# Altium footprint library Item_pcb.PcbLib: 282 footprints (part 17 of 18)
Each footprint in its own frame and in the unit in brackets; x right, y up, seen from the top. Pads: shape width x height; smd on the part's side, far side on the other; paste and mask are expansions set on the pad; w line width, h text height; cw(c..) or ccw(c..) is an arc to the next point about the centre after c.
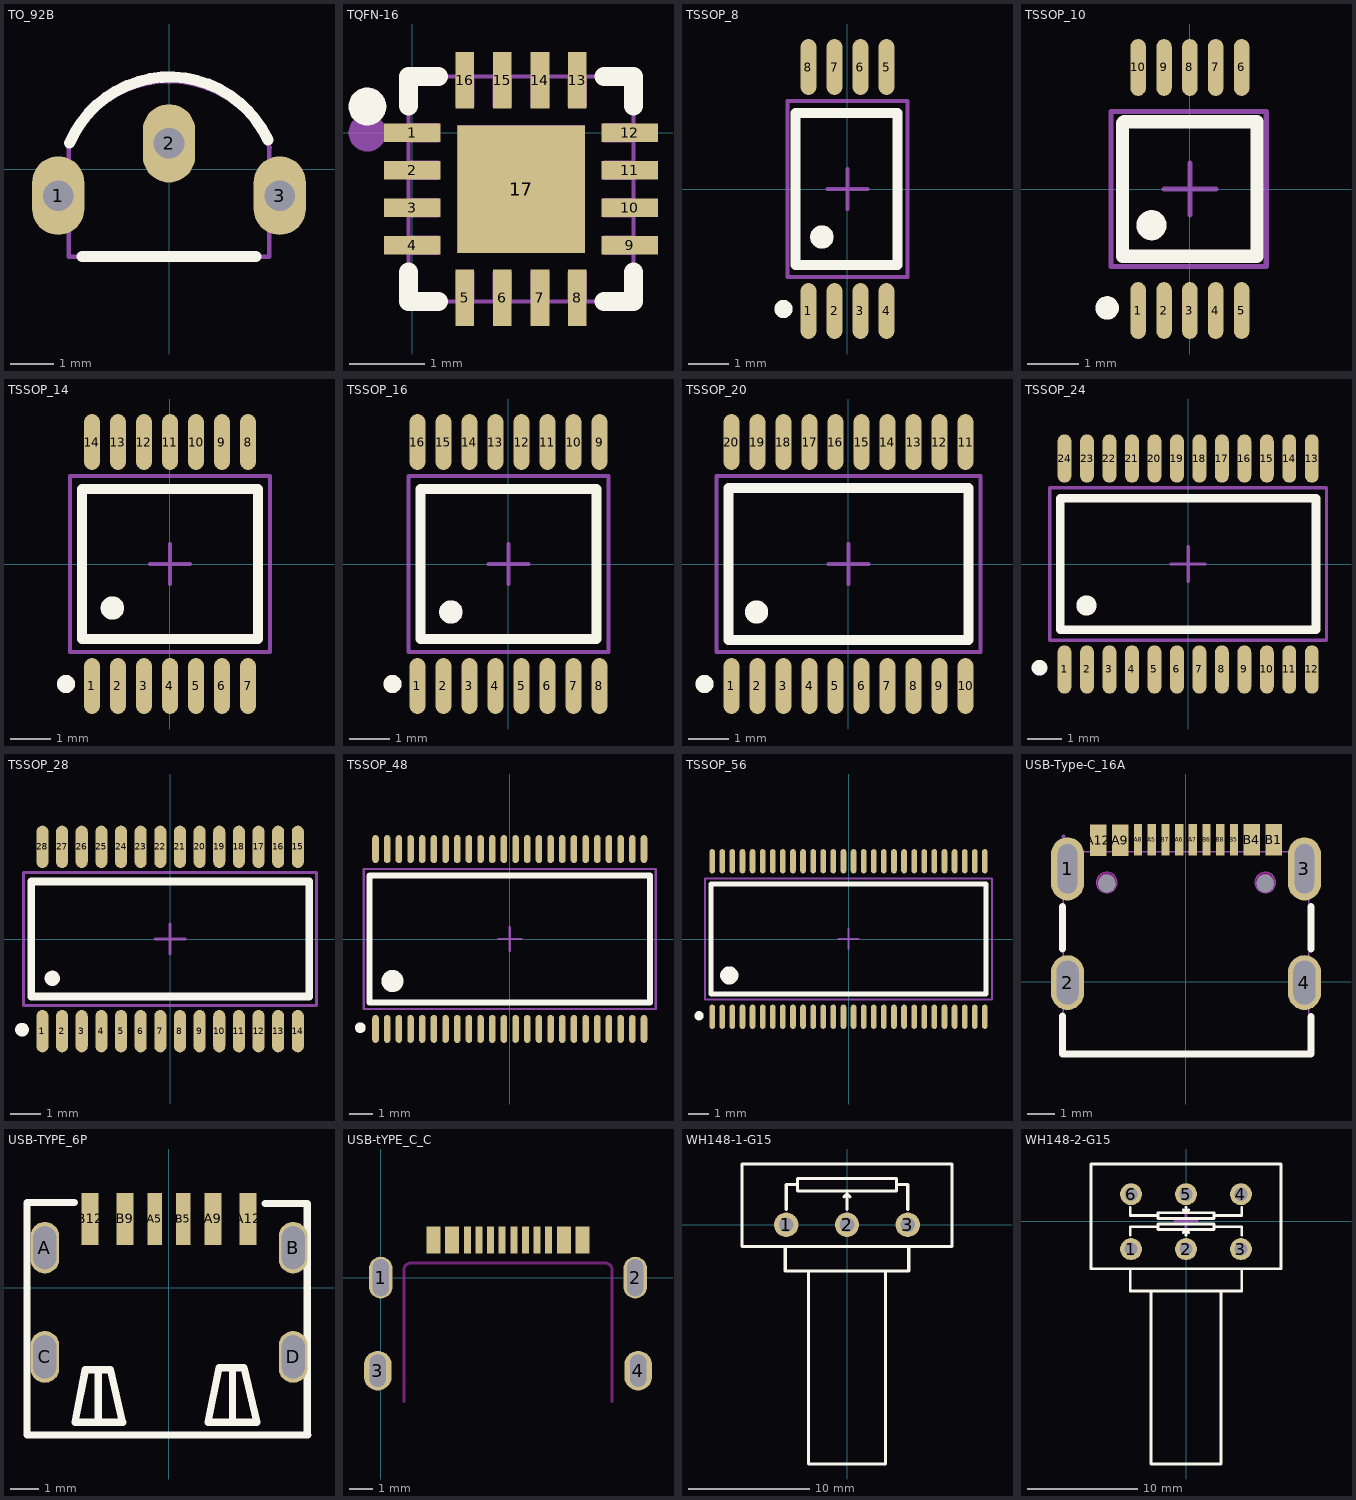
[diagram p16: the footprints below, top view; thin cyan lines are the x and y axes]

## TO_92B [mm]
pads (3):
  oval 1.2x1.8 hole 0.7: 1(-2.54,-0.6) 2(0,0.6) 3(2.54,-0.6)
Top Overlay:
  lines w0.254: -2.277,0.603 cw(c0.011,-0.363) 2.267,0.677 ; -2,-2 2,-2
Mechanical 15:
  lines w0.1: -2.309,0.504 cw(c0,-0.5) 2.309,0.504 ; -2.3,0.5 -2.3,-2 2.3,-2 2.3,0.5
3D body "TO-92B.STEP": height 7.34, standoff -0.7, extent -2.8,-2 2.88,1.8

## TQFN-16 [mm]
pads (17):
  rect 0.75x0.25 smd paste-100 mask+0.051: 1(0,0) 2(0,-0.5) 3(0,-1) 4(0,-1.5) 9(2.9,-1.498) 10(2.9,-0.998) 11(2.9,-0.498) 12(2.9,0.001)
  rect 0.25x0.75 smd paste-100 mask+0.051: 5(0.7,-2.198) 6(1.2,-2.198) 7(1.7,-2.198) 8(2.2,-2.198) 13(2.2,0.702) 14(1.7,0.702) 15(1.2,0.702) 16(0.7,0.702)
  rect 1.7x1.7 smd paste-100 mask+0.051: 17(1.45,-0.749)
Top Overlay:
  circle w0.254: c-0.6,0.352 r0.125
  lines w0.254: -0.05,-1.856 -0.05,-2.249 0.346,-2.249 ; -0.05,0.356 -0.05,0.751 0.346,0.751 ; 2.558,-2.249 2.95,-2.249 2.95,-1.855 ; 2.558,0.751 2.95,0.751 2.95,0.356
Top Paste:
  region: 2.13,-0.069 2.13,-1.429 0.77,-1.429 0.77,-0.069
  region: 2.075,0.327 2.325,0.327 2.325,1.077 2.075,1.077
  region: 1.575,0.327 1.825,0.327 1.825,1.077 1.575,1.077
  region: 1.075,0.327 1.325,0.327 1.325,1.077 1.075,1.077
  region: 0.575,0.327 0.825,0.327 0.825,1.077 0.575,1.077
  region: 2.075,-2.573 2.325,-2.573 2.325,-1.823 2.075,-1.823
  region: 1.575,-2.573 1.825,-2.573 1.825,-1.823 1.575,-1.823
  region: 1.075,-2.573 1.325,-2.573 1.325,-1.823 1.075,-1.823
  region: 0.575,-2.573 0.825,-2.573 0.825,-1.823 0.575,-1.823
  region: 3.275,-0.124 3.275,0.126 2.525,0.126 2.525,-0.124
  region: 3.275,-0.624 3.275,-0.374 2.525,-0.374 2.525,-0.624
  region: 3.275,-1.124 3.275,-0.874 2.525,-0.874 2.525,-1.124
  region: 3.275,-1.624 3.275,-1.374 2.525,-1.374 2.525,-1.624
  region: 0.375,-0.125 0.375,0.125 -0.375,0.125 -0.375,-0.125
  region: 0.375,-0.625 0.375,-0.375 -0.375,-0.375 -0.375,-0.625
  region: 0.375,-1.125 0.375,-0.875 -0.375,-0.875 -0.375,-1.125
  region: 0.375,-1.625 0.375,-1.375 -0.375,-1.375 -0.375,-1.625
Mechanical 6:
  circle w0.25: c-0.6,0.002 r0.125
Mechanical 15:
  region: 0.01,0.752 0.009,0.776 -0.025,0.81 -0.074,0.81 -0.109,0.776 -0.11,0.752 -0.11,0.727 -0.075,0.693 -0.026,0.693 0.009,0.727
  region: 0.825,0.352 0.575,0.352 0.575,0.752 0.825,0.752
  region: 1.325,0.352 1.075,0.352 1.075,0.752 1.325,0.752
  region: 1.825,0.352 1.575,0.352 1.575,0.752 1.825,0.752
  region: 2.325,0.352 2.075,0.352 2.075,0.752 2.325,0.752
  region: 2.95,0.126 2.95,-0.124 2.55,-0.124 2.55,0.126
  region: 2.95,-0.374 2.95,-0.624 2.55,-0.624 2.55,-0.374
  region: 2.95,-0.874 2.95,-1.124 2.55,-1.124 2.55,-0.874
  region: 2.95,-1.373 2.95,-1.623 2.55,-1.623 2.55,-1.373
  region: 2.075,-1.848 2.325,-1.848 2.325,-2.248 2.075,-2.248
  region: 1.575,-1.848 1.825,-1.848 1.825,-2.248 1.575,-2.248
  region: 1.075,-1.848 1.325,-1.848 1.325,-2.248 1.075,-2.248
  region: 0.575,-1.848 0.825,-1.848 0.825,-2.248 0.575,-2.248
  region: -0.05,-1.625 -0.05,-1.375 0.35,-1.375 0.35,-1.625
  region: -0.05,-1.125 -0.05,-0.875 0.35,-0.875 0.35,-1.125
  region: -0.05,-0.625 -0.05,-0.375 0.35,-0.375 0.35,-0.625
  region: -0.05,-0.125 -0.05,0.125 0.35,0.125 0.35,-0.125
  region: 2.3,0.101 2.3,-1.599 0.6,-1.599 0.6,0.101
  lines w0.051: -0.05,-2.248 2.95,-2.248 2.95,0.752 -0.05,0.752 -0.05,-2.248
3D body "3D_PCB2_2024-03-27-CH343_end.STEP": height 0.91, standoff 0.1, extent -0.077,-2.258 2.943,0.762

## TSSOP_8 [mm] "0.65"
pads (8):
  oval 0.4x1.4 smd: 1(-0.975,-3.05) 2(-0.325,-3.05) 3(0.325,-3.05) 4(0.975,-3.05) 5(0.975,3.05) 6(0.325,3.05) 7(-0.325,3.05) 8(-0.975,3.05)
Top Overlay:
  circle w0.254: c-1.6,-3 r0.1
  circle w0.3: c-0.641,-1.2 r0.141
  lines w0.254: -1.3,-1.9 -1.3,1.9 1.25,1.9 1.25,-1.9 -1.3,-1.9
Mechanical 15:
  lines w0.1: -0.5,0 0.5,0 ; 0,-0.5 0,0.5 ; -1.5,-2.2 -1.5,2.2 1.5,2.2 1.5,-2.2 -1.5,-2.2
3D body "TSSOP-8.STEP": height 1.2, standoff 0, extent -1.5,-3.2 1.5,3.2

## TSSOP_10 [mm] "0.5"
pads (10):
  oval 0.3x1.1 smd: 1(-1,-2.35) 2(-0.5,-2.35) 3(0,-2.35) 4(0.5,-2.35) 5(1,-2.35) 6(1,2.35) 7(0.5,2.35) 8(0,2.35) 9(-0.5,2.35) 10(-1,2.35)
Top Overlay:
  circle w0.254: c-1.6,-2.3 r0.1
  circle w0.3: c-0.741,-0.7 r0.141
  lines w0.254: -1.3,-1.3 -1.3,1.275 -1.275,1.3 1.3,1.3 1.3,-1.3 -1.275,-1.3
Mechanical 15:
  lines w0.1: -0.5,0 0.5,0 ; 0,-0.5 0,0.5 ; -1.525,-1.5 1.475,-1.5 1.475,1.5 -1.525,1.5 -1.525,-1.5
3D body "TSSOP-10.step": height 1.1, standoff 0, extent -1.5,-2.5 1.5,2.5

## TSSOP_14 [mm] "0.65"
pads (14):
  oval 0.4x1.4 smd: 1(-1.95,-3.05) 2(-1.3,-3.05) 3(-0.65,-3.05) 4(0,-3.05) 5(0.65,-3.05) 6(1.3,-3.05) 7(1.95,-3.05) 8(1.95,3.05) 9(1.3,3.05) 10(0.65,3.05) 11(0,3.05) 12(-0.65,3.05) 13(-1.3,3.05) 14(-1.95,3.05)
Top Overlay:
  circle w0.254: c-2.6,-3 r0.1
  circle w0.3: c-1.441,-1.1 r0.141
  lines w0.254: -2.2,-1.875 2.2,-1.875 2.2,1.875 -2.2,1.875 -2.2,-1.875
Mechanical 15:
  lines w0.1: -0.5,0 0.5,0 ; 0,-0.5 0,0.5 ; -2.5,-2.2 -2.5,2.2 2.5,2.2 2.5,-2.2 -2.5,-2.2
3D body "TSSOP-14.STEP": height 1.2, standoff 0, extent -2.5,-3.2 2.5,3.2

## TSSOP_16 [mm] "0.65"
pads (16):
  oval 0.4x1.4 smd: 1(-2.275,-3.05) 2(-1.625,-3.05) 3(-0.975,-3.05) 4(-0.325,-3.05) 5(0.325,-3.05) 6(0.975,-3.05) 7(1.625,-3.05) 8(2.275,-3.05) 9(2.275,3.05) 10(1.625,3.05) 11(0.975,3.05) 12(0.325,3.05) 13(-0.325,3.05) 14(-0.975,3.05) 15(-1.625,3.05) 16(-2.275,3.05)
Top Overlay:
  circle w0.3: c-1.441,-1.2 r0.141
  circle w0.254: c-2.9,-3 r0.1
  lines w0.254: -2.2,-1.875 2.2,-1.875 2.2,1.875 -2.2,1.875 -2.2,-1.875
Mechanical 15:
  lines w0.1: -0.5,0 0.5,0 ; 0,-0.5 0,0.5 ; -2.5,-2.2 2.5,-2.2 2.5,2.2 -2.5,2.2 -2.5,-2.2
3D body "TSSOP-16.STEP": height 1.2, standoff 0, extent -2.5,-3.2 2.5,3.2

## TSSOP_20 [mm] "0.65"
pads (20):
  oval 0.4x1.4 smd: 1(-2.925,-3.05) 2(-2.275,-3.05) 3(-1.625,-3.05) 4(-0.975,-3.05) 5(-0.325,-3.05) 6(0.325,-3.05) 7(0.975,-3.05) 8(1.625,-3.05) 9(2.275,-3.05) 10(2.925,-3.05) 11(2.925,3.05) 12(2.275,3.05) 13(1.625,3.05) 14(0.975,3.05) 15(0.325,3.05) 16(-0.325,3.05) 17(-0.975,3.05) 18(-1.625,3.05) 19(-2.275,3.05) 20(-2.925,3.05)
Top Overlay:
  circle w0.3: c-2.3,-1.2 r0.141
  circle w0.254: c-3.6,-3 r0.1
  lines w0.254: -3,-1.9 -3,1.9 3,1.9 3,-1.9 -3,-1.9
Mechanical 15:
  lines w0.1: -0.5,0 0.5,0 ; 0,-0.5 0,0.5 ; -3.3,-2.2 -3.3,2.2 3.3,2.2 3.3,-2.2 -3.3,-2.2
3D body "TSSOP-20.STEP": height 1.2, standoff 0, extent -3.25,-3.2 3.25,3.2

## TSSOP_24 [mm] "0.65"
pads (24):
  oval 0.4x1.4 smd: 1(-3.575,-3.05) 2(-2.925,-3.05) 3(-2.275,-3.05) 4(-1.625,-3.05) 5(-0.975,-3.05) 6(-0.325,-3.05) 7(0.325,-3.05) 8(0.975,-3.05) 9(1.625,-3.05) 10(2.275,-3.05) 11(2.925,-3.05) 12(3.575,-3.05) 13(3.575,3.05) 14(2.925,3.05) 15(2.275,3.05) 16(1.625,3.05) 17(0.975,3.05) 18(0.325,3.05) 19(-0.325,3.05) 20(-0.975,3.05) 21(-1.625,3.05) 22(-2.275,3.05) 23(-2.925,3.05) 24(-3.575,3.05)
Top Overlay:
  circle w0.3: c-2.941,-1.2 r0.141
  circle w0.254: c-4.3,-3 r0.1
  lines w0.254: -3.7,-1.9 3.7,-1.9 3.7,1.9 -3.7,1.9 -3.7,-1.9
Mechanical 15:
  lines w0.1: -0.5,0 0.5,0 ; 0,-0.5 0,0.5 ; -4,-2.2 4,-2.2 4,2.2 -4,2.2 -4,-2.2
3D body "TSSOP-24.STEP": height 1.2, standoff 0, extent -3.9,-3.2 3.9,3.2

## TSSOP_28 [mm] "0.65"
pads (28):
  oval 0.4x1.4 smd: 1(-4.225,-3.05) 2(-3.575,-3.05) 3(-2.925,-3.05) 4(-2.275,-3.05) 5(-1.625,-3.05) 6(-0.975,-3.05) 7(-0.325,-3.05) 8(0.325,-3.05) 9(0.975,-3.05) 10(1.625,-3.05) 11(2.275,-3.05) 12(2.925,-3.05) 13(3.575,-3.05) 14(4.225,-3.05) 15(4.225,3.05) 16(3.575,3.05) 17(2.925,3.05) 18(2.275,3.05) 19(1.625,3.05) 20(0.975,3.05) 21(0.325,3.05) 22(-0.325,3.05) 23(-0.975,3.05) 24(-1.625,3.05) 25(-2.275,3.05) 26(-2.925,3.05) 27(-3.575,3.05) 28(-4.225,3.05)
Top Overlay:
  circle w0.254: c-4.9,-3 r0.1
  circle w0.3: c-3.9,-1.3 r0.1
  lines w0.254: -4.6,-1.9 -4.6,1.9 4.6,1.9 4.6,-1.9 -4.6,-1.9
Mechanical 15:
  lines w0.1: -0.5,0 0.5,0 ; 0,-0.5 0,0.5 ; -4.85,-2.2 -4.85,2.2 4.85,2.2 4.85,-2.2 -4.85,-2.2
3D body "TSSOP-28.STEP": height 1.2, standoff 0, extent -4.85,-3.2 4.85,3.2

## TSSOP_48 [mm] "0.5"
pads (48):
  oval 0.28x1.2 smd: 1(-5.75,-3.85) 2(-5.25,-3.85) 3(-4.75,-3.85) 4(-4.25,-3.85) 5(-3.75,-3.85) 6(-3.25,-3.85) 7(-2.75,-3.85) 8(-2.25,-3.85) 9(-1.75,-3.85) 10(-1.25,-3.85) 11(-0.75,-3.85) 12(-0.25,-3.85) 13(0.25,-3.85) 14(0.75,-3.85) 15(1.25,-3.85) 16(1.75,-3.85) 17(2.25,-3.85) 18(2.75,-3.85) 19(3.25,-3.85) 20(3.75,-3.85) 21(4.25,-3.85) 22(4.75,-3.85) 23(5.25,-3.85) 24(5.75,-3.85) 25(5.75,3.85) 26(5.25,3.85) 27(4.75,3.85) 28(4.25,3.85) 29(3.75,3.85) 30(3.25,3.85) 31(2.75,3.85) 32(2.25,3.85) 33(1.75,3.85) 34(1.25,3.85) 35(0.75,3.85) 36(0.25,3.85) 37(-0.25,3.85) 38(-0.75,3.85) 39(-1.25,3.85) 40(-1.75,3.85) 41(-2.25,3.85) 42(-2.75,3.85) 43(-3.25,3.85) 44(-3.75,3.85) 45(-4.25,3.85) 46(-4.75,3.85) 47(-5.25,3.85) 48(-5.75,3.85)
Top Overlay:
  circle w0.254: c-6.4,-3.8 r0.1
  circle w0.5: c-5.024,-1.8 r0.224
  lines w0.254: -6,-2.725 6,-2.725 6,2.725 -6,2.725 -6,-2.725
Mechanical 15:
  lines w0.1: -0.5,0 0.5,0 ; 0,-0.5 0,0.5 ; -6.25,-3 -6.25,3 6.25,3 6.25,-3 -6.25,-3
3D body "TSSOP-48.STEP": height 1.2, standoff 0, extent -6.25,-4.05 6.25,4.05

## TSSOP_56 [mm] "0.5"
pads (56):
  oval 0.28x1.2 smd: 1(-6.75,-3.85) 2(-6.25,-3.85) 3(-5.75,-3.85) 4(-5.25,-3.85) 5(-4.75,-3.85) 6(-4.25,-3.85) 7(-3.75,-3.85) 8(-3.25,-3.85) 9(-2.75,-3.85) 10(-2.25,-3.85) 11(-1.75,-3.85) 12(-1.25,-3.85) 13(-0.75,-3.85) 14(-0.25,-3.85) 15(0.25,-3.85) 16(0.75,-3.85) 17(1.25,-3.85) 18(1.75,-3.85) 19(2.25,-3.85) 20(2.75,-3.85) 21(3.25,-3.85) 22(3.75,-3.85) 23(4.25,-3.85) 24(4.75,-3.85) 25(5.25,-3.85) 26(5.75,-3.85) 27(6.25,-3.85) 28(6.75,-3.85) 29(6.75,3.85) 30(6.25,3.85) 31(5.75,3.85) 32(5.25,3.85) 33(4.75,3.85) 34(4.25,3.85) 35(3.75,3.85) 36(3.25,3.85) 37(2.75,3.85) 38(2.25,3.85) 39(1.75,3.85) 40(1.25,3.85) 41(0.75,3.85) 42(0.25,3.85) 43(-0.25,3.85) 44(-0.75,3.85) 45(-1.25,3.85) 46(-1.75,3.85) 47(-2.25,3.85) 48(-2.75,3.85) 49(-3.25,3.85) 50(-3.75,3.85) 51(-4.25,3.85) 52(-4.75,3.85) 53(-5.25,3.85) 54(-5.75,3.85) 55(-6.25,3.85) 56(-6.75,3.85)
Top Overlay:
  circle w0.254: c-7.4,-3.8 r0.1
  circle w0.5: c-5.9,-1.8 r0.2
  lines w0.254: -6.8,-2.725 6.8,-2.725 6.8,2.725 -6.8,2.725 -6.8,-2.725
Mechanical 15:
  lines w0.1: -0.5,0 0.5,0 ; 0,-0.5 0,0.5 ; -7.1,-3 -7.1,3 7.1,3 7.1,-3 -7.1,-3
3D body "TSSOP-56.STEP": height 1.14, standoff -0.4, extent -7.04,-4.045 7.04,4.1

## USB-Type-C_16A [mm]
pads (18):
  round 0 hole 0.65: 0(-2.889,3.592) 0(2.891,3.592)
  oval 1.199x2.301 hole 0.701 slot 1.801 at 90 deg mask+0.051: 1(-4.32,4.123) 3(4.321,4.123)
  oval 1.199x1.999 hole 0.8 slot 1.6 at 90 deg mask+0.051: 2(-4.32,-0.025) 4(4.321,-0.025)
  rect 0.3x1.151 smd mask+0.05: A5(-1.249,5.179) A6(-0.248,5.177) A7(0.25,5.177) A8(-1.749,5.177) B5(1.751,5.177) B6(0.75,5.177) B7(-0.749,5.177) B8(1.25,5.177)
  rect 0.599x1.151 smd mask+0.05: A9(-2.4,5.174) A12(-3.2,5.174) B1(3.201,5.177) B4(2.401,5.177)
Top Overlay:
  lines w0.254: -4.5,-1.25 -4.5,-2.626 4.557,-2.626 4.557,-1.255 ; -4.5,1.197 -4.5,2.751 ; 4.557,1.202 4.557,2.743
Top Paste:
  region: 2.901,5.753 3.501,5.753 3.501,4.603 2.901,4.603
  region: 2.101,5.753 2.701,5.753 2.701,4.603 2.101,4.603
  region: 1.601,5.753 1.901,5.753 1.901,4.603 1.601,4.603
  region: 1.101,5.751 1.4,5.751 1.4,4.603 1.101,4.603
  region: 0.6,5.753 0.902,5.753 0.902,4.603 0.6,4.603
  region: 0.102,5.751 0.402,5.751 0.402,4.6 0.102,4.6
  region: -0.398,5.753 -0.098,5.753 -0.098,4.603 -0.398,4.603
  region: -0.898,5.751 -0.599,5.751 -0.599,4.6 -0.898,4.6
  region: -1.399,5.753 -1.099,5.753 -1.099,4.603 -1.399,4.603
  region: -1.899,5.751 -1.599,5.751 -1.599,4.603 -1.899,4.603
  region: -2.699,5.748 -2.1,5.748 -2.1,4.598 -2.699,4.598
  region: -3.499,5.748 -2.897,5.748 -2.897,4.598 -3.499,4.598
  region: -4.919,0.374 -4.919,0.493 -4.828,0.714 -4.659,0.883 -4.438,0.974 -4.199,0.974 -3.978,0.883 -3.809,0.714 -3.718,0.493 -3.718,0.374 -3.718,-0.427 -3.718,-0.546 -3.809,-0.767 -3.978,-0.936 -4.199,-1.027 -4.438,-1.027 -4.659,-0.936 -4.828,-0.767 -4.919,-0.546 -4.919,-0.427
  region: -4.919,4.674 -4.919,4.793 -4.828,5.014 -4.659,5.183 -4.438,5.274 -4.199,5.274 -3.978,5.183 -3.809,5.014 -3.718,4.793 -3.718,4.674 -3.718,3.574 -3.718,3.454 -3.809,3.234 -3.978,3.065 -4.199,2.973 -4.438,2.973 -4.659,3.065 -4.828,3.234 -4.919,3.454 -4.919,3.574
  region: 3.722,0.374 3.722,0.493 3.813,0.713 3.982,0.882 4.202,0.973 4.44,0.973 4.661,0.882 4.829,0.713 4.921,0.493 4.921,0.374 4.921,-0.427 4.921,-0.546 4.829,-0.766 4.661,-0.935 4.44,-1.026 4.202,-1.026 3.982,-0.935 3.813,-0.766 3.722,-0.546 3.722,-0.427
  region: 3.722,4.674 3.722,4.793 3.813,5.013 3.982,5.182 4.202,5.273 4.44,5.273 4.661,5.182 4.829,5.013 4.921,4.793 4.921,4.674 4.921,3.574 4.921,3.455 4.829,3.234 4.661,3.066 4.44,2.975 4.202,2.975 3.982,3.066 3.813,3.234 3.722,3.455 3.722,3.574
Keep-Out Layer:
  board cut-out: 3.267,3.625 3.267,3.7 3.21,3.838 3.104,3.943 2.966,4.001 2.816,4.001 2.678,3.943 2.573,3.838 2.515,3.7 2.515,3.625 2.515,3.55 2.573,3.412 2.678,3.306 2.816,3.249 2.966,3.249 3.104,3.306 3.21,3.412 3.267,3.55
  board cut-out: -2.514,3.625 -2.514,3.7 -2.571,3.838 -2.677,3.943 -2.815,4.001 -2.965,4.001 -3.103,3.943 -3.209,3.838 -3.266,3.7 -3.266,3.625 -3.266,3.55 -3.209,3.412 -3.103,3.306 -2.965,3.249 -2.815,3.249 -2.677,3.306 -2.571,3.412 -2.514,3.55
Mechanical 1:
  circle w0.005: c2.891,3.625 r0.376
  circle w0.005: c-2.89,3.625 r0.376
Mechanical 6:
  circle w0.3: c-2.89,3.625 r0.15
  circle w0.3: c2.891,3.625 r0.15
Mechanical 15:
  region: 4.171,0.374 4.471,0.374 4.471,-0.427 4.171,-0.427
  region: -4.47,0.374 -4.17,0.374 -4.17,-0.427 -4.47,-0.427
  region: 4.171,4.674 4.471,4.674 4.471,3.574 4.171,3.574
  region: -4.47,4.674 -4.17,4.674 -4.17,3.574 -4.47,3.574
  region: 3.021,5.555 3.422,5.555 3.422,4.956 3.021,4.956
  region: 2.249,5.555 2.65,5.555 2.65,4.956 2.249,4.956
  region: -3.428,5.55 -3.03,5.55 -3.03,4.951 -3.428,4.951
  region: -2.651,5.55 -2.25,5.55 -2.25,4.951 -2.651,4.951
  region: -1.848,5.553 -1.65,5.553 -1.65,4.953 -1.848,4.953
  region: -1.351,5.553 -1.15,5.553 -1.15,4.953 -1.351,4.953
  region: -0.85,5.553 -0.65,5.553 -0.65,4.953 -0.85,4.953
  region: -0.35,5.553 -0.149,5.553 -0.149,4.953 -0.35,4.953
  region: 0.151,5.553 0.351,5.553 0.351,4.953 0.151,4.953
  region: 0.651,5.553 0.852,5.553 0.852,4.953 0.651,4.953
  region: 1.151,5.553 1.352,5.553 1.352,4.953 1.151,4.953
  region: 1.652,5.553 1.85,5.553 1.85,4.953 1.652,4.953
  region: -4.409,5.301 -4.409,5.326 -4.444,5.362 -4.495,5.362 -4.531,5.326 -4.531,5.301 -4.531,5.276 -4.495,5.24 -4.444,5.24 -4.409,5.276
  lines w0.051: -4.47,-2.603 4.471,-2.603 4.471,4.747 -4.47,4.747 -4.47,-2.603
3D body "USB Type-C_A.STEP": height 3.25, standoff -0.85, extent -4.47,-2.625 4.47,5.275

## USB-TYPE_6P [mm]
pads (10):
  oval 1x1.8 hole 0.8 slot 1.5 at 90 deg: A(-4.318,1.4) B(4.318,1.4) C(-4.318,-2.4) D(4.318,-2.4)
  rect 0.5x1.8 smd: A5(-0.498,2.4) B5(0.502,2.4)
  rect 0.6x1.8 smd: A9(1.532,2.4) A12(2.752,2.4) B9(-1.528,2.4) B12(-2.748,2.4)
Top Overlay:
  lines w0.254: -4.938,-5.112 -4.938,2.97 -3.287,2.97 ; -4.928,-5.112 4.822,-5.112 ; -2.463,-4.648 -2.463,-2.948 ; 2.212,-4.673 2.212,-2.773 ; 3.339,2.94 4.762,2.94 ; 4.812,-5.112 4.812,2.94 ; -3.273,-4.673 -2.913,-2.849 -2.038,-2.849 -1.611,-4.673 -3.273,-4.673 ; 1.362,-4.673 3.057,-4.673 2.612,-2.773 1.737,-2.773 1.362,-4.673
3D body "USB Type-C_B.STEP": height 3.22, standoff -0.94, extent -4.468,-5 4.472,1.8

## USB-tYPE_C_C [mm]
pads (20):
  oval 1x1.8 hole 0.7 slot 1.6 at 90 deg: 1(0,0) 2(10.946,0)
  oval 1.2x1.7 hole 0.7 slot 1.4 at 90 deg: 3(-0.127,-4) 4(11.073,-4)
  rect 0.3x1.168 smd: A1(2.123,1.625) A4(2.923,1.625) A5(4.223,1.625) A6(5.223,1.625) A7(5.723,1.625) A8(3.723,1.625) A9(8.023,1.625) A12(8.823,1.625) B1(8.523,1.625) B4(7.723,1.625) B5(7.223,1.625) B6(6.223,1.625) B7(4.723,1.625) B8(6.723,1.625) B9(3.223,1.625) B12(2.423,1.625)
Keep-Out Layer:
  lines w0.127: 0.995,0.33 cw(c1.295,0.33) 1.295,0.63 ; 0.999,-5.334 0.999,0.333 ; 1.3,0.635 9.646,0.635 ; 9.651,0.63 cw(c9.651,0.33) 9.951,0.33 ; 9.948,-5.334 9.948,0.333
3D body "usbt_H0_48-L8_3.STEP": height 2.27, standoff -0.89, extent -0.275,-7.391 11.125,0.909

## WH148-1-G15 [mm] "单联电位器，脚距：5mm，柄长：15mm"
pads (3):
  round 2 hole 1.2: 1(-5,0) 2(0,0) 3(5,0)
Top Overlay:
  lines w0.254: -5.08,-1.778 -5.08,-3.8 5.08,-3.8 5.08,-1.778 ; -5,1.27 -5,3.302 -4.064,3.302 ; -3.175,-3.81 -3.175,-19.685 3.175,-19.685 3.175,-3.81 ; -0.254,2.286 0,2.54 ; 0,1.27 0,2.54 ; 0.254,2.286 0,2.54 ; 4.064,3.302 4.572,3.302 5,3.302 5,1.27 ; -8.636,-1.778 -8.636,5 8.636,5 8.636,-1.778 -8.636,-1.778 ; -4.064,2.794 -4.064,3.81 4.064,3.81 4.064,2.794 -4.064,2.794
3D body "WH148-1-G15.STEP": height 20.95, standoff -3.8, extent -8.45,-19.5 8.45,4.8

## WH148-2-G15 [mm] "双联电位器，脚距：5mm，柄长：15mm"
pads (6):
  round 2 hole 1.2: 1(-5,-2.54) 2(0,-2.54) 3(5,-2.54) 4(5,2.46) 5(0,2.46) 6(-5,2.46)
Top Overlay:
  lines w0.254: -5.08,-4.318 -5.08,-6.34 5.08,-6.34 5.08,-4.318 ; -5.08,-1.27 -5.08,-0.508 -2.54,-0.508 ; -5.08,1.27 -5.08,0.508 -2.54,0.508 ; -3.175,-6.35 -3.175,-22.098 3.175,-22.098 3.175,-6.35 ; -0.254,-1.016 0,-0.762 ; -0.254,1.016 0,0.762 ; 0,-1.27 0,-0.762 ; 0,1.27 0,0.762 ; 0.254,-1.016 0,-0.762 ; 0.254,1.016 0,0.762 ; 2.54,-0.508 5.08,-0.508 5.08,-1.27 ; 2.54,0.508 5.08,0.508 5.08,1.27 ; -2.54,-0.508 -2.54,-0.762 2.54,-0.762 2.54,-0.254 -2.54,-0.254 -2.54,-0.508 ; -2.54,0.508 -2.54,0.254 2.54,0.254 2.54,0.762 -2.54,0.762 -2.54,0.508 ; -8.636,-4.318 -8.636,5.207 8.636,5.207 8.636,-4.318 -8.636,-4.318
Mechanical 15:
  lines w0.254: -1.016,0 1.016,0 ; 0,-0.762 0,1.016
3D body "WH148-2-G15.STEP": height 20.95, standoff -3.8, extent -8.45,-22 8.45,5.009